# Altium footprint library ICs_rus.PCBLIB: 103 footprints (part 7 of 7)
Each footprint in its own frame and in the unit in brackets; x right, y up, seen from the top. Pads: shape width x height; smd on the part's side, far side on the other; paste and mask are expansions set on the pad; w line width, h text height; cw(c..) or ccw(c..) is an arc to the next point about the centre after c.
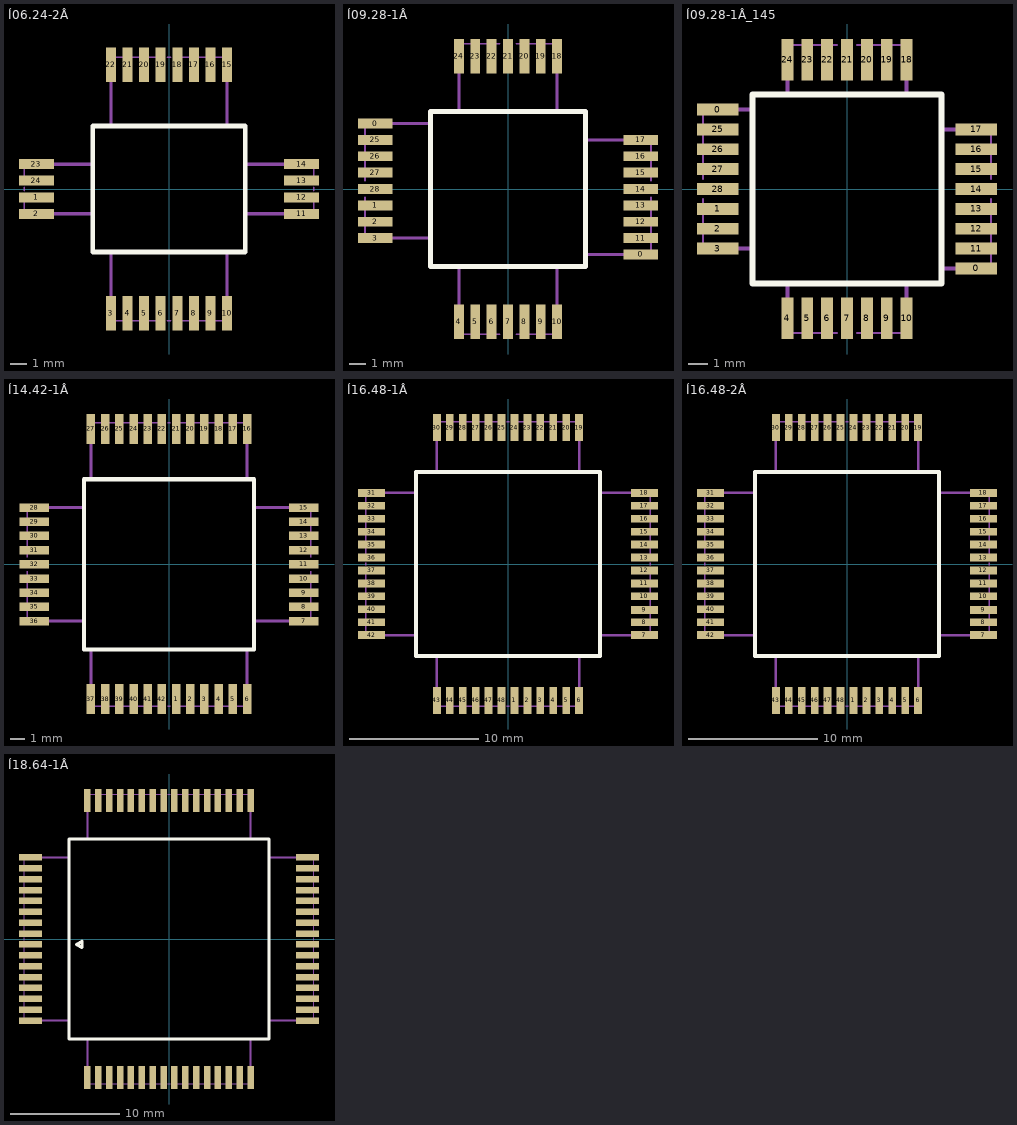
[diagram p6: the footprints below, top view; thin cyan lines are the x and y axes]

## Í06.24-2Â [mm]
height 3
pads (24):
  rect 2.1x0.6 smd: 1(-8,-0.5) 2(-8,-1.5) 11(8,-1.5) 12(8,-0.5) 13(8,0.5) 14(8,1.5) 23(-8,1.5) 24(-8,0.5)
  rect 0.6x2.1 smd: 3(-3.5,-7.5) 4(-2.5,-7.5) 5(-1.5,-7.5) 6(-0.5,-7.5) 7(0.5,-7.5) 8(1.5,-7.5) 9(2.5,-7.5) 10(3.5,-7.5) 15(3.5,7.5) 16(2.5,7.5) 17(1.5,7.5) 18(0.5,7.5) 19(-0.5,7.5) 20(-1.5,7.5) 21(-2.5,7.5) 22(-3.5,7.5)
Top Overlay:
  lines w0.3: -4.6,-3.8 4.6,-3.8 4.6,3.8 -4.6,3.8 -4.6,-3.8
Mechanical 1:
  lines w0.1: -8.74,-1.5 -8.74,-0.49 ; -8.74,-0.09 -8.74,0.11 ; -8.74,0.51 -8.74,1.5 ; -3.5,-7.94 -0.5,-7.94 ; -3.5,7.94 -0.5,7.94 ; -0.1,-7.94 0.1,-7.94 ; -0.1,7.94 0.1,7.94 ; 0.5,-7.94 3.5,-7.94 ; 0.5,7.94 3.5,7.94 ; 8.74,-1.5 8.74,-0.5 ; 8.74,-0.1 8.74,0.1 ; 8.74,0.5 8.74,1.5
  lines w0.2: -8.74,-1.5 -4.6,-1.5 ; -8.74,1.5 -4.6,1.5 ; -3.5,-7.94 -3.5,-3.8 ; -3.5,3.8 -3.5,7.94 ; 3.5,-7.94 3.5,-3.8 ; 3.5,3.8 3.5,7.94 ; 4.6,-1.5 8.74,-1.5 ; 4.6,1.5 8.74,1.5 ; -4.6,-3.8 4.6,-3.8 4.6,3.8 -4.6,3.8 -4.6,-3.8
  text "15" at 2.861,2.382 h1.5
  text "14" at 2.861,0.732 h1.5
  text "24" at -3.739,0.482 h1.5
  text "22" at -3.739,2.382 h1.5
  text "10" at 2.861,-3.038 h1.5
  text "11" at 2.861,-1.118 h1.5
  text "1" at -3.633,-0.918 h1.5
  text "3" at -3.613,-3.038 h1.5
  text ".Designator" at -1.2,0.7 h1.5
  text ".Comment" at -3.1,-1.4 h1.5

## Í09.28-1Â [mm]
height 3
pads (30):
  rect 2.1x0.6 smd: 0(-8.125,4) 0(8.125,-4) 1(-8.125,-1) 2(-8.125,-2) 3(-8.125,-3) 11(8.125,-3) 12(8.125,-2) 13(8.125,-1) 14(8.125,0) 15(8.125,1) 16(8.125,2) 17(8.125,3) 25(-8.125,3) 26(-8.125,2) 27(-8.125,1) 28(-8.125,0)
  rect 0.6x2.1 smd: 4(-3,-8.125) 5(-2,-8.125) 6(-1,-8.125) 7(0,-8.125) 8(1,-8.125) 9(2,-8.125) 10(3,-8.125) 18(3,8.125) 19(2,8.125) 20(1,8.125) 21(0,8.125) 22(-1,8.125) 23(-2,8.125) 24(-3,8.125)
Top Overlay:
  lines w0.3: -4.75,-4.75 -4.75,4.75 4.75,4.75 4.75,-4.75 -4.75,-4.75
Mechanical 1:
  lines w0.1: -8.75,-3 -8.75,-0.5 ; -8.75,-0.1 -8.75,0.1 ; -8.75,0.5 -8.75,4 ; -3,-8.875 -0.5,-8.875 ; -3,8.875 -0.5,8.875 ; -0.1,-8.875 0.1,-8.875 ; -0.1,8.875 0.1,8.875 ; 0.5,-8.875 3,-8.875 ; 0.5,8.875 3,8.875 ; 8.75,-4 8.75,-0.5 ; 8.75,-0.1 8.75,0.1 ; 8.75,0.5 8.75,3
  lines w0.2: -8.75,-3 -4.75,-3 ; -8.75,4 -4.75,4 ; -3,-8.875 -3,-4.75 ; -3,4.75 -3,8.875 ; 3,-8.875 3,-4.75 ; 3,4.75 3,8.875 ; 4.75,-4 8.75,-4 ; 4.75,3 8.75,3 ; -4.75,-4.75 -4.75,4.75 4.75,4.75 4.75,-4.75 -4.75,-4.75
  text ".Comment" at -3.1,-1.4 h1.5
  text ".Designator" at -1.2,0.7 h1.5
  text "3" at -4.125,-3.25 h1.5
  text "1" at -4.125,-1.5 h1.5
  text "11" at 3.25,-3.375 h1.5
  text "10" at 2.125,-4.25 h1.5
  text "25" at -4.25,2.375 h1.5
  text "28" at -4.25,-0.25 h1.5
  text "14" at 2.861,0.732 h1.5
  text "17" at 3.125,2.125 h1.5
  text "4" at -3.375,-4.375 h1.5
  text "18" at 2.25,3.5 h1.5
  text "24" at -3.375,3.5 h1.5
3D body: height 3, standoff 0, extent -8.875,-8.875 8.805,8.805

## Í09.28-1Â_145 [mm]
height 3
pads (30):
  rect 2.1x0.6 smd: 0(-6.5,4) 0(6.5,-4) 1(-6.5,-1) 2(-6.5,-2) 3(-6.5,-3) 11(6.5,-3) 12(6.5,-2) 13(6.5,-1) 14(6.5,0) 15(6.5,1) 16(6.5,2) 17(6.5,3) 25(-6.5,3) 26(-6.5,2) 27(-6.5,1) 28(-6.5,0)
  rect 0.6x2.1 smd: 4(-3,-6.5) 5(-2,-6.5) 6(-1,-6.5) 7(0,-6.5) 8(1,-6.5) 9(2,-6.5) 10(3,-6.5) 18(3,6.5) 19(2,6.5) 20(1,6.5) 21(0,6.5) 22(-1,6.5) 23(-2,6.5) 24(-3,6.5)
Top Overlay:
  lines w0.3: -4.75,-4.75 4.75,-4.75 4.75,4.75 -4.75,4.75 -4.75,-4.75
Mechanical 1:
  lines w0.1: -7.25,-3 -7.25,-0.5 ; -7.25,-0.1 -7.25,0.1 ; -7.25,0.5 -7.25,4 ; -3,-7.25 -0.5,-7.25 ; -3,7.25 -0.5,7.25 ; -0.1,-7.25 0.1,-7.25 ; -0.1,7.25 0.1,7.25 ; 0.5,-7.25 3,-7.25 ; 0.5,7.25 3,7.25 ; 7.25,-4 7.25,-0.5 ; 7.25,-0.1 7.25,0.1 ; 7.25,0.5 7.25,3
  lines w0.2: -7.25,-3 -4.75,-3 ; -7.25,4 -4.75,4 ; -3,-7.25 -3,-4.75 ; -3,4.75 -3,7.25 ; 3,-7.25 3,-4.75 ; 3,4.75 3,7.25 ; 4.75,-4 7.25,-4 ; 4.75,3 7.25,3 ; -4.75,-4.75 4.75,-4.75 4.75,4.75 -4.75,4.75 -4.75,-4.75
  text "24" at -3.375,3.5 h1.5
  text "18" at 2.25,3.5 h1.5
  text "4" at -3.375,-4.375 h1.5
  text "17" at 3.125,2.125 h1.5
  text "14" at 2.861,0.732 h1.5
  text "28" at -4.25,-0.25 h1.5
  text "25" at -4.25,2.375 h1.5
  text "10" at 2.125,-4.25 h1.5
  text "11" at 3.25,-3.375 h1.5
  text "1" at -4.125,-1.5 h1.5
  text "3" at -4.125,-3.25 h1.5
  text ".Designator" at -1.2,0.7 h1.5
  text ".Comment" at -3.1,-1.4 h1.5
3D body: height 3, standoff 0, extent -7.25,-7.25 7.25,7.25

## Í14.42-1Â [mm]
pads (42):
  rect 0.6x2.1 smd: 1(0.5,-9.5) 2(1.5,-9.5) 3(2.5,-9.5) 4(3.5,-9.5) 5(4.5,-9.5) 6(5.5,-9.5) 16(5.5,9.55) 17(4.5,9.55) 18(3.5,9.55) 19(2.5,9.55) 20(1.5,9.55) 21(0.5,9.55) 22(-0.5,9.55) 23(-1.5,9.55) 24(-2.5,9.55) 25(-3.5,9.55) 26(-4.5,9.55) 27(-5.5,9.55) 37(-5.5,-9.5) 38(-4.5,-9.5) 39(-3.5,-9.5) 40(-2.5,-9.5) 41(-1.5,-9.5) 42(-0.5,-9.5)
  rect 2.1x0.6 smd: 7(9.5,-4) 8(9.5,-3) 9(9.5,-2) 10(9.5,-1) 11(9.5,0) 12(9.5,1) 13(9.5,2) 14(9.5,3) 15(9.5,4) 28(-9.5,4) 29(-9.5,3) 30(-9.5,2) 31(-9.5,1) 32(-9.5,0) 33(-9.5,-1) 34(-9.5,-2) 35(-9.5,-3) 36(-9.5,-4)
Top Overlay:
  lines w0.3: -6,-6 6,-6 6,6 -6,6 -6,-6
Mechanical 1:
  lines w0.1: -10,-4 -10,-0.5 ; -10,-0.1 -10,0.1 ; -10,0.5 -10,4 ; -5.5,-10 -0.5,-10 ; -5.5,10 -0.5,10 ; -0.1,-10 0.1,-10 ; -0.1,10 0.1,10 ; 0.5,-10 5.5,-10 ; 0.5,10 5.5,10 ; 10,-4 10,-0.5 ; 10,-0.1 10,0.1 ; 10,0.5 10,4
  lines w0.2: -10,-4 -6.1,-4 ; -10,4 -6.1,4 ; -5.5,-10 -5.5,-6.1 ; -5.5,6.1 -5.5,10 ; 5.5,-10 5.5,-6.1 ; 5.5,6.1 5.5,10 ; 6.1,-4 10,-4 ; 6.1,4 10,4 ; -6,-6 6,-6 6,6 -6,6 -6,-6
  text "15" at 3.052,2.946 h1.5
  text "7" at 4.276,-4.554 h1.5
  text "1" at 0.026,-5.554 h1.5
  text "42" at -2.698,-5.554 h1.5
  text "28" at -5.948,2.946 h1.5
  text "36" at -6.198,-4.554 h1.5
  text ".Comment" at -3,-1.5 h1.5
  text ".Designator" at -1.1,0.6 h1.5
3D body: height 3, standoff 0, extent -10.2,-10.2 10.1,10.1

## Í16.48-1Â [mm]
pads (48):
  rect 0.6x2.1 smd: 1(0.5,-10.55) 2(1.5,-10.55) 3(2.5,-10.55) 4(3.5,-10.55) 5(4.5,-10.55) 6(5.5,-10.55) 19(5.5,10.55) 20(4.5,10.55) 21(3.5,10.55) 22(2.5,10.55) 23(1.5,10.55) 24(0.5,10.55) 25(-0.5,10.55) 26(-1.5,10.55) 27(-2.5,10.55) 28(-3.5,10.55) 29(-4.5,10.55) 30(-5.5,10.55) 43(-5.5,-10.55) 44(-4.5,-10.55) 45(-3.5,-10.55) 46(-2.5,-10.55) 47(-1.5,-10.55) 48(-0.5,-10.55)
  rect 2.1x0.6 smd: 7(10.55,-5.5) 8(10.55,-4.5) 9(10.55,-3.55) 10(10.55,-2.5) 11(10.55,-1.5) 12(10.55,-0.5) 13(10.55,0.5) 14(10.55,1.5) 15(10.55,2.5) 16(10.55,3.5) 17(10.55,4.5) 18(10.55,5.5) 31(-10.55,5.5) 32(-10.55,4.5) 33(-10.55,3.5) 34(-10.55,2.5) 35(-10.55,1.5) 36(-10.55,0.5) 37(-10.55,-0.5) 38(-10.55,-1.5) 39(-10.55,-2.5) 40(-10.55,-3.5) 41(-10.55,-4.5) 42(-10.55,-5.5)
Top Overlay:
  lines w0.3: -7.1,-7.1 -7.1,7.1 7.1,7.1 7.1,-7.1 -7.1,-7.1
Mechanical 1:
  lines w0.1: -11,-5.5 -11,-0.5 ; -11,-0.1 -11,0.1 ; -11,0.5 -11,5.5 ; -5.5,-11 -0.5,-11 ; -5.5,11 -0.5,11 ; -0.1,-11 0.1,-11 ; -0.1,11 0.1,11 ; 0.5,-11 5.5,-11 ; 0.5,11 5.5,11 ; 11,-5.5 11,-0.5 ; 11,-0.1 11,0.1 ; 11,0.5 11,5.5
  lines w0.2: -11,-5.5 -7.1,-5.5 ; -11,5.5 -7.1,5.5 ; -5.5,-11 -5.5,-7.1 ; -5.5,7.1 -5.5,11 ; 5.5,-11 5.5,-7.1 ; 5.5,7.1 5.5,11 ; 7.1,-5.5 11,-5.5 ; 7.1,5.5 11,5.5 ; -7.1,-7.1 -7.1,7.1 7.1,7.1 7.1,-7.1 -7.1,-7.1
  text "30" at -5.2,5.8 h1.5
  text "19" at 3.8,5.9 h1.5
  text "6" at 4.8,-6.7 h1.5
  text "43" at -6,-6.7 h1.5
  text "18" at 5.3,5 h1.5
  text "7" at 5.376,-5.554 h1.5
  text "1" at 0.3,-6.7 h1.5
  text "48" at -1.4,-6.7 h1.5
  text "31" at -6.6,4.6 h1.5
  text "42" at -6.7,-5.3 h1.5
  text ".Designator" at -1.4,0.6 h1.5
  text ".Comment" at -3.3,-1.5 h1.5
3D body: height 3, standoff 0, extent -11,-11 11,11

## Í16.48-2Â [mm]
pads (48):
  rect 0.6x2.1 smd: 1(0.5,-10.55) 2(1.5,-10.55) 3(2.5,-10.55) 4(3.5,-10.55) 5(4.5,-10.55) 6(5.5,-10.55) 19(5.5,10.55) 20(4.5,10.55) 21(3.5,10.55) 22(2.5,10.55) 23(1.5,10.55) 24(0.5,10.55) 25(-0.5,10.55) 26(-1.5,10.55) 27(-2.5,10.55) 28(-3.5,10.55) 29(-4.5,10.55) 30(-5.5,10.55) 43(-5.5,-10.55) 44(-4.5,-10.55) 45(-3.5,-10.55) 46(-2.5,-10.55) 47(-1.5,-10.55) 48(-0.5,-10.55)
  rect 2.1x0.6 smd: 7(10.55,-5.5) 8(10.55,-4.5) 9(10.55,-3.55) 10(10.55,-2.5) 11(10.55,-1.5) 12(10.55,-0.5) 13(10.55,0.5) 14(10.55,1.5) 15(10.55,2.5) 16(10.55,3.5) 17(10.55,4.5) 18(10.55,5.5) 31(-10.55,5.5) 32(-10.55,4.5) 33(-10.55,3.5) 34(-10.55,2.5) 35(-10.55,1.5) 36(-10.55,0.5) 37(-10.55,-0.5) 38(-10.55,-1.5) 39(-10.55,-2.5) 40(-10.55,-3.5) 41(-10.55,-4.5) 42(-10.55,-5.5)
Top Overlay:
  lines w0.3: -7.1,-7.1 7.1,-7.1 7.1,7.1 -7.1,7.1 -7.1,-7.1
Mechanical 1:
  lines w0.1: -11,-5.5 -11,-0.5 ; -11,-0.1 -11,0.1 ; -11,0.5 -11,5.5 ; -5.5,-11 -0.5,-11 ; -5.5,11 -0.5,11 ; -0.1,-11 0.1,-11 ; -0.1,11 0.1,11 ; 0.5,-11 5.5,-11 ; 0.5,11 5.5,11 ; 11,-5.5 11,-0.5 ; 11,-0.1 11,0.1 ; 11,0.5 11,5.5
  lines w0.2: -11,-5.5 -7.1,-5.5 ; -11,5.5 -7.1,5.5 ; -5.5,-11 -5.5,-7.1 ; -5.5,7.1 -5.5,11 ; 5.5,-11 5.5,-7.1 ; 5.5,7.1 5.5,11 ; 7.1,-5.5 11,-5.5 ; 7.1,5.5 11,5.5 ; -7.1,-7.1 7.1,-7.1 7.1,7.1 -7.1,7.1 -7.1,-7.1
  text ".Comment" at -3.3,-1.5 h1.5
  text ".Designator" at -1.4,0.6 h1.5
  text "42" at -6.7,-5.3 h1.5
  text "31" at -6.6,4.6 h1.5
  text "48" at -1.4,-6.7 h1.5
  text "1" at 0.3,-6.7 h1.5
  text "7" at 5.376,-5.554 h1.5
  text "18" at 5.3,5 h1.5
  text "43" at -6,-6.7 h1.5
  text "6" at 4.8,-6.7 h1.5
  text "19" at 3.8,5.9 h1.5
  text "30" at -5.2,5.8 h1.5
3D body: height 3, standoff 0, extent -11,-11 11,11

## Í18.64-1Â [mm]
pads (64):
  rect 2.1x0.6 smd: 1(-12.75,-0.5) 2(-12.75,-1.5) 3(-12.75,-2.5) 4(-12.75,-3.5) 5(-12.75,-4.5) 6(-12.75,-5.5) 7(-12.75,-6.5) 8(-12.75,-7.5) 25(12.75,-7.5) 26(12.75,-6.5) 27(12.75,-5.5) 28(12.75,-4.5) 29(12.75,-3.5) 30(12.75,-2.5) 31(12.75,-1.5) 32(12.75,-0.5) 33(12.75,0.5) 34(12.75,1.5) 35(12.75,2.5) 36(12.75,3.5) 37(12.75,4.5) 38(12.75,5.5) 39(12.75,6.5) 40(12.75,7.5) 57(-12.75,7.5) 58(-12.75,6.5) 59(-12.75,5.5) 60(-12.75,4.5) 61(-12.75,3.5) 62(-12.75,2.5) 63(-12.75,1.5) 64(-12.75,0.5)
  rect 0.6x2.1 smd: 9(-7.5,-12.75) 10(-6.5,-12.75) 11(-5.5,-12.75) 12(-4.5,-12.75) 13(-3.5,-12.75) 14(-2.5,-12.75) 15(-1.5,-12.75) 16(-0.5,-12.75) 17(0.5,-12.75) 18(1.5,-12.75) 19(2.5,-12.75) 20(3.5,-12.75) 21(4.5,-12.75) 22(5.5,-12.75) 23(6.5,-12.75) 24(7.5,-12.75) 41(7.5,12.75) 42(6.5,12.75) 43(5.5,12.75) 44(4.5,12.75) 45(3.5,12.75) 46(2.5,12.75) 47(1.5,12.75) 48(0.5,12.75) 49(-0.5,12.75) 50(-1.5,12.75) 51(-2.5,12.75) 52(-3.5,12.75) 53(-4.5,12.75) 54(-5.5,12.75) 55(-6.5,12.75) 56(-7.5,12.75)
Top Overlay:
  lines w0.3: -9.2,-9.2 -9.2,9.2 9.2,9.2 9.2,-9.2 -9.2,-9.2 ; -8.5,-0.5 -8,-0.789 -8,-0.211 -8.5,-0.5
Mechanical 1:
  lines w0.1: -13.3,-7.5 -13.3,-0.5 ; -13.3,-0.1 -13.3,0.1 ; -13.3,0.5 -13.3,7.5 ; -7.5,-13.3 -0.5,-13.3 ; -7.5,13.3 -0.5,13.3 ; -0.1,-13.3 0.1,-13.3 ; -0.1,13.3 0.1,13.3 ; 0.5,-13.3 7.5,-13.3 ; 0.5,13.3 7.5,13.3 ; 13.3,-7.5 13.3,-0.5 ; 13.3,-0.1 13.3,0.1 ; 13.3,0.5 13.3,7.5
  lines w0.2: -13.3,-7.5 -9.2,-7.5 ; -13.3,7.5 -9.2,7.5 ; -7.5,-13.3 -7.5,-9.2 ; -7.5,9.2 -7.5,13.3 ; 7.5,-13.3 7.5,-9.2 ; 7.5,9.2 7.5,13.3 ; 9.2,-7.5 13.3,-7.5 ; 9.2,7.5 13.3,7.5 ; -9.2,-9.2 -9.2,9.2 9.2,9.2 9.2,-9.2 -9.2,-9.2
  text "9" at -7.2,-10.85 h1.5
  text "56" at -7.25,10.45 h1.5
  text "24" at 5.9,-10.75 h1.5
  text "25" at 10.1,-7.3 h1.5
  text "41" at 6.15,10.4 h1.5
  text "40" at 10.05,6.3 h1.5
  text "8" at -11.25,-7.2 h1.5
  text "64" at -11.3,0.25 h1.5
  text "1" at -11.2,-0.85 h1.5
  text "57" at -11.35,6.35 h1.5
  text ".Comment" at -3.5,-1.3 h1.5
  text ".Designator" at -1.6,0.8 h1.5
3D body: height 3, standoff 0, extent -13.3,-13.3 13.3,13.3